# Altium footprint library AMA4B_adapter_board.PcbLib: 84 footprints (part 3 of 6)
Each footprint in its own frame and in the unit in brackets; x right, y up, seen from the top. Pads: shape width x height; smd on the part's side, far side on the other; paste and mask are expansions set on the pad; w line width, h text height; cw(c..) or ccw(c..) is an arc to the next point about the centre after c.
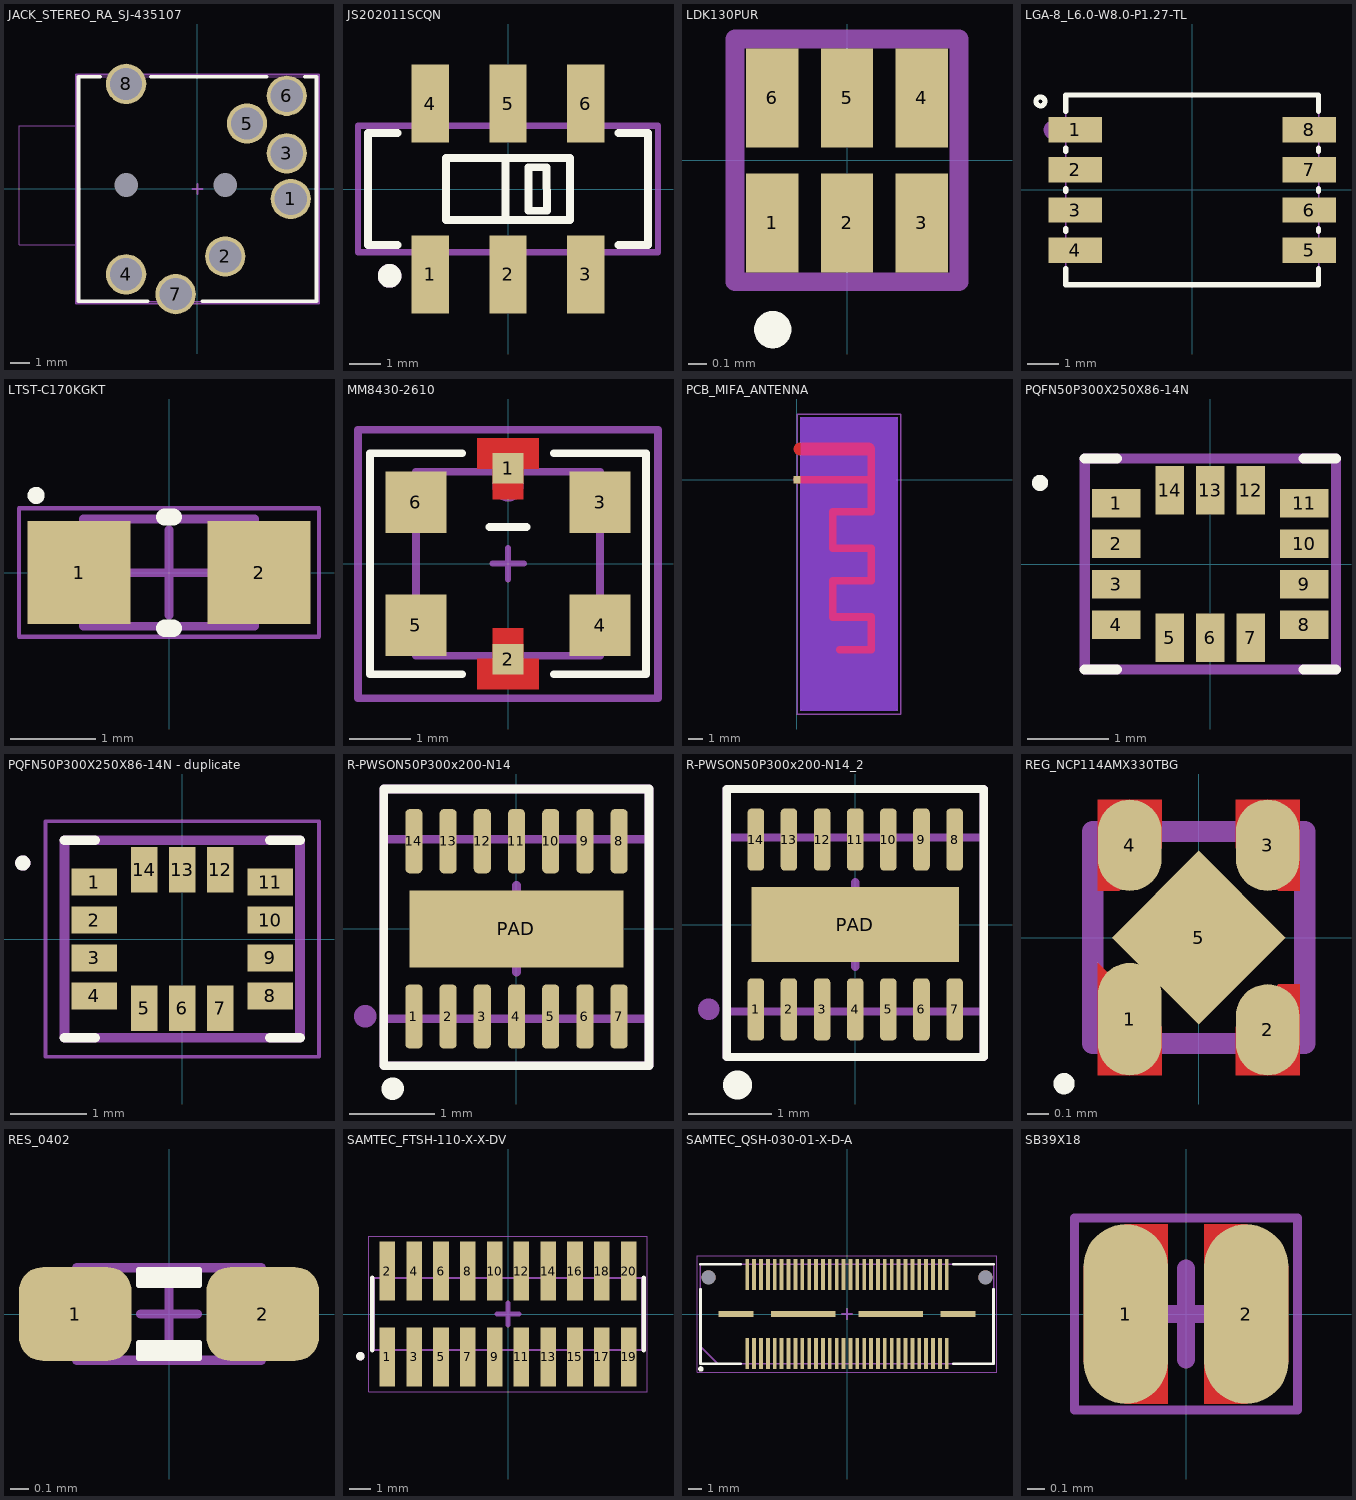
[diagram p2: the footprints below, top view; thin cyan lines are the x and y axes]

## JACK_STEREO_RA_SJ-435107 [mil] "JACK_STEREO_RA_SJ-435107"
pads (10):
  round 80 hole 64: 1(185.1,-19.75) 2(55.1,-133.85) 3(177.2,70.85) 4(-141.7,-169.35) 5(98.4,129.85) 6(177.2,185.05) 7(-43.3,-208.65) 8(-141.7,208.65)
  round 10 hole 47 unplated: ""(-141.7,7.85) ""(55.1,7.85)
Top Overlay:
  lines w1: -236.2,-222.45 -236.2,222.45 ; 236.2,-222.45 236.2,222.45
  lines w7.1: -192.9,222.45 -236.2,222.45 -236.2,-222.45 -98.4,-222.45 ; -92.5,222.45 137.8,222.45 ; 9.9,-222.45 236.2,-222.45 236.2,222.45 212.6,222.45
Board Shape:
  lines w1: -236.2,-110.25 -354.3,-110.25 -354.3,125.95 -236.2,125.95 ; -236.2,-222.45 -236.2,222.45 236.2,222.45 236.2,-222.45 -236.2,-222.45
  text ".Designator" at -14.81,-81.28 h40
Top Courtyard:
  lines w4: -241.2,-227.45 -241.2,227.45 241.2,227.45 241.2,-227.45 -241.2,-227.45
Top Component Center:
  lines w4: -10,0 10,0 ; 0,-10 0,10
3D body: height 250, standoff 0, extent -236.2,-222.45 236.2,222.45
3D body: height 248, standoff 12, extent -354.3,-110.15 -236.3,125.85

## JS202011SCQN [mm]
pads (6):
  rect 1.2x2.5 smd: 1(-2.5,-2.75) 2(0,-2.75) 3(2.5,-2.75) 4(-2.5,2.75) 5(0,2.75) 6(2.5,2.75)
Top Overlay:
  circle w0.508: c-3.81,-2.794 r0.127
  lines w0.254: -3.556,-1.8 -4.5,-1.8 -4.5,1.8 -3.556,1.8 ; -0.08,-1 -0.08,1 ; 3.556,-1.8 4.5,-1.8 4.5,1.8 3.556,1.8 ; -2,-1 -2,1 2,1 2,-1 -2,-1 ; 0.66,-0.7 0.66,0.7 1.24,0.7 1.26,-0.7 0.66,-0.7
Board Shape:
  circle w0.508: c-3.81,-2.794 r0.127
  lines w0.203: -0.08,-1 -0.08,1 ; -4.826,-2.032 -4.826,2.032 4.826,2.032 4.826,-2.032 -4.826,-2.032 ; -2,-1 2,-1 2,1 -2,1 -2,-1 ; 0.66,-0.7 0.66,0.7 1.24,0.7 1.26,-0.7 0.66,-0.7
  text ".Designator" at -3.008,-3.409 h1.52
3D body "JS.stp": height 3.6, standoff 0, extent -4.6,-3.5 4.6,3.5

## LDK130PUR [mm]
pads (6):
  rect 0.28x0.53 smd: 1(-0.4,-0.335) 2(0,-0.335) 3(0.4,-0.335) 4(0.4,0.335) 5(0,0.335) 6(-0.4,0.335)
Top Overlay:
  lines w0.1: -0.397,-0.957 ccw(c-0.397,-0.907) -0.397,-0.857 ccw(c-0.397,-0.907) -0.397,-0.957
Top 3D Body:
  lines w0.1: -0.6,-0.65 -0.6,0.65 0.6,0.65 0.6,-0.65 -0.6,-0.65
3D body "LDK130PU-R.stp": height 0.51, standoff 0, extent -0.648,-0.597 0.648,0.597

## LGA-8_L6.0-W8.0-P1.27-TL [mm]
pads (8):
  rect 1.7x0.8 smd: 1(-3.7,1.905) 2(-3.7,0.635) 3(-3.7,-0.635) 4(-3.7,-1.905) 5(3.7,-1.905) 6(3.7,-0.635) 7(3.7,0.635) 8(3.7,1.905)
Top Overlay:
  circle w0.16: c-4.8,2.8 r0.141
  lines w0.16: -4,-2.489 -4,-3 4,-3 4,-2.489 ; -4,-1.321 -4,-1.219 ; -4,-0.051 -4,0.051 ; -4,1.219 -4,1.321 ; -4,2.489 -4,3 4,3 4,2.489 ; 4,-1.321 4,-1.219 ; 4,-0.051 4,0.051 ; 4,1.219 4,1.321
Mechanical 6:
  circle w0.3: c-4.4,1.9 r0.15
Top Courtyard:
  region: -4,2.28 -3.25,2.28 -3.25,1.53 -4,1.53
  region: -4,1.01 -3.25,1.01 -3.25,0.26 -4,0.26
  region: -4,-0.26 -3.25,-0.26 -3.25,-1.01 -4,-1.01
  region: -4,-1.53 -3.25,-1.53 -3.25,-2.28 -4,-2.28
  region: 3.25,2.28 4,2.28 4,1.53 3.25,1.53
  region: 3.25,1.01 4,1.01 4,0.26 3.25,0.26
  region: 3.25,-0.26 4,-0.26 4,-1.01 3.25,-1.01
  region: 3.25,-1.53 4,-1.53 4,-2.28 3.25,-2.28
  region: -3.94,3 -3.941,3.025 -3.976,3.059 -4.025,3.059 -4.06,3.025 -4.06,3 -4.06,2.976 -4.025,2.941 -3.976,2.941 -3.941,2.976 -3.94,3
  lines w0.051: -4,-3 -4,3 4,3 4,-3 -4,-3
3D body "W25N01GVZEIG_TR.stp": height 0.8, standoff 0, extent -4.05,-3 4.05,3

## LTST-C170KGKT [mm] "SMD, 2-Leads, Body 2.00x1.25mm"
height 1.1
pads (2):
  rect 1.2x1.2 smd: 1(-1.05,0) 2(1.05,0)
Top Overlay:
  circle w0.1: c-1.55,0.9 r0.05
  lines w0.2: -0.05,-0.65 0.05,-0.65 ; -0.05,0.65 0.05,0.65
Board Shape:
  rectangle: -1,-0.625 -0.731,0.625
  lines w0.1: -1,-0.625 1,-0.625 1,0.625 -1,0.625 -1,-0.625
  text ".Designator" at 2.289,0.23 h1.02
Top Courtyard:
  lines w0.05: -1.75,-0.75 -1.75,0.75 1.75,0.75 1.75,-0.75 -1.75,-0.75
Top Component Center:
  lines w0.1: -0.5,0 0.5,0 ; 0,-0.5 0,0.5
3D body: height 0.5, standoff 0, extent -1,-0.625 1,0.625
3D body: height 1.1, standoff 0.5, extent -0.7,-0.625 0.7,0.625

## MM8430-2610 [mm] "MM8430-2610"
pads (6):
  rect 0.498x0.498 smd paste+0 mask+0.102: 1(0,1.557)
  rect 0.5x0.5 smd mask+0.102: 2(0,-1.557)
  rect 1.001x1.001 smd mask+0.05: 3(1.501,1.001) 4(1.501,-1.001) 5(-1.501,-1.001) 6(-1.501,1.001)
Top Layer:
  region: -0.249,1.049 -0.249,1.549 -0.5,1.549 -0.5,2.05 0.5,2.05 0.5,1.549 0.249,1.549 0.249,1.049
  region: 0.249,-1.049 0.249,-1.549 0.5,-1.549 0.5,-2.05 -0.5,-2.05 -0.5,-1.549 -0.249,-1.549 -0.249,-1.049
  region: 0.249,-1.049 0.249,-1.549 0.5,-1.549 0.5,-2.05 -0.5,-2.05 -0.5,-1.549 -0.249,-1.549 -0.249,-1.049
Top Overlay:
  lines w0.127: -0.749,-1.801 -2.25,-1.801 -2.25,1.801 -0.749,1.801 ; -0.3,0.6 0.3,0.6 ; 0.749,-1.801 2.25,-1.801 2.25,1.801 0.749,1.801
Top Paste:
  region: 0.249,-1.049 0.249,-1.549 0.5,-1.549 0.5,-2.05 -0.5,-2.05 -0.5,-1.549 -0.249,-1.549 -0.249,-1.049
  region: 0.249,-1.049 0.249,-1.549 0.5,-1.549 0.5,-2.05 -0.5,-2.05 -0.5,-1.549 -0.249,-1.549 -0.249,-1.049
  region: -0.249,1.049 -0.249,1.549 -0.5,1.549 -0.5,2.05 0.5,2.05 0.5,1.549 0.249,1.549 0.249,1.049
  region: -0.249,1.049 -0.249,1.549 -0.5,1.549 -0.5,2.05 0.5,2.05 0.5,1.549 0.249,1.549 0.249,1.049
Top Solder:
  region: -0.3,0.998 -0.3,1.499 -0.551,1.499 -0.551,2.098 0.551,2.098 0.551,1.499 0.3,1.499 0.3,0.998
  region: 0.3,-0.998 0.3,-1.499 0.551,-1.499 0.551,-2.098 -0.551,-2.098 -0.551,-1.499 -0.3,-1.499 -0.3,-0.998
Board Shape:
  circle w0.254: c0,1.27 r0.127
  lines w0.127: -1.501,-1.501 1.501,-1.501 1.501,1.501 -1.501,1.501 -1.501,-1.501
  text ".Designator" at -0.165,2.366 h1.02
Top Courtyard:
  lines w0.127: -2.446,-2.194 2.446,-2.194 2.446,2.186 -2.446,2.186 -2.446,-2.194
Top Component Center:
  lines w0.102: -0.252,0.004 0.256,0.004 ; 0,-0.254 0,0.254
3D body "User Library-MM8430-2610.STEP": height 1.75, standoff 0, extent -1.5,-1.496 1.5,1.504

## PCB_MIFA_ANTENNA [mil] "PCB_MIFA_ANTENNA"
pads (1):
  rect 19x20.7 smd paste+0 mask+4: 1(0,0)
Top Layer:
  lines w20.7: 0.9,0.1 200.9,0.1 ; 115.9,-458.9 200.9,-458.9 200.9,-370.9 96.9,-370.9 96.9,-272.9 200.9,-272.9 200.9,-184.9 96.9,-184.9 96.9,-86.9 200.9,-86.9 200.9,0.1 ; 200.9,83.1 200.9,0.1
  lines w36: 8.9,83.1 192.9,83.1
Top Layer keep-out:
  region: 182.89,59.13 182.89,15.91 10.9,15.91 10.9,59.13
  region: 43.9,124.91 43.9,108.04 11,108.04 11,124.91 11,167.4 268.9,167.4 268.9,-622.6 11,-622.6 11,-22.13 168.9,-22.13 168.9,-56.09 75.99,-56.09 75.99,-211.29 174.01,-211.29 174.01,-248.27 75.99,-248.27 75.99,-397.45 168.9,-397.45 168.9,-432.28 75.99,-432.28 75.99,-485.16 231.19,-485.16 231.19,-340.27 121.99,-340.27 121.99,-295.13 231.19,-295.13 231.19,-160.13 121.99,-160.13 121.99,-113.27 231.19,-113.27 231.19,124.91
Mid-Layer 1 keep-out:
  region: 11,-622.6 271,-622.6 271,167.4 11,167.4
Bottom Layer keep-out:
  region: 11,-622.6 271,-622.6 271,167.4 11,167.4
Top Overlay:
  text ".Designator" at -86.1,168.1 h40
Board Shape:
  lines w4: 11,-622.6 271,-622.6 271,167.4 11,167.4 11,-622.6
  text ".Designator" at 45,120 h40
  text "PCB Antenna" at 160.44,-100 h40
  text "No Assembly Req'd" at 102.51,-45 h40
Top Courtyard:
  lines w4: 1,-632.6 281,-632.6 281,177.4 1,177.4 1,-632.6
Top Component Center:
  lines w4: -10,0 10,0 ; 0,-10 0,10

## PQFN50P300X250X86-14N [mm]
pads (14):
  rect 0.6x0.35 smd: 1(-1.16,0.75) 2(-1.16,0.25) 3(-1.16,-0.25) 4(-1.16,-0.75) 8(1.16,-0.75) 9(1.16,-0.25) 10(1.16,0.25) 11(1.16,0.75)
  rect 0.35x0.6 smd: 5(-0.5,-0.91) 6(0,-0.91) 7(0.5,-0.91) 12(0.5,0.91) 13(0,0.91) 14(-0.5,0.91)
Top Overlay:
  circle w0.1: c-2.1,1 r0.05
  lines w0.127: -1.55,-1.3 -1.15,-1.3 ; -1.55,1.3 -1.15,1.3 ; 1.15,-1.3 1.55,-1.3 ; 1.15,1.3 1.55,1.3
Top Assembly:
  lines w0.127: -1.55,-1.3 1.55,-1.3 1.55,1.3 -1.55,1.3 -1.55,-1.3
  text ".Designator" at -1.126,-0.113 h0.5
3D body "step_temp.STEP": height 0.86, standoff 0, extent -1.5,-1.25 1.5,1.25

## PQFN50P300X250X86-14N - duplicate [mm]
pads (14):
  rect 0.6x0.35 smd: 1(-1.16,0.75) 2(-1.16,0.25) 3(-1.16,-0.25) 4(-1.16,-0.75) 8(1.16,-0.75) 9(1.16,-0.25) 10(1.16,0.25) 11(1.16,0.75)
  rect 0.35x0.6 smd: 5(-0.5,-0.91) 6(0,-0.91) 7(0.5,-0.91) 12(0.5,0.91) 13(0,0.91) 14(-0.5,0.91)
Top Overlay:
  circle w0.1: c-2.1,1 r0.05
  lines w0.127: -1.55,-1.3 -1.15,-1.3 ; -1.55,1.3 -1.15,1.3 ; 1.15,-1.3 1.55,-1.3 ; 1.15,1.3 1.55,1.3
Top 3D Body:
  circle w0.1: c-2.1,1 r0.05
  lines w0.127: -1.55,-1.3 1.55,-1.3 1.55,1.3 -1.55,1.3 -1.55,-1.3
Top Courtyard:
  lines w0.05: -1.8,-1.55 -1.8,1.55 1.8,1.55 1.8,-1.55 -1.8,-1.55

## R-PWSON50P300x200-N14 [mm] "Texas Instruments DPU Package"
pads (15):
  rrect50% 0.2x0.75 smd mask+0.05: 1(-1.2,-1.025) 2(-0.8,-1.025) 3(-0.4,-1.025) 4(0,-1.025) 5(0.4,-1.025) 6(0.8,-1.025) 7(1.2,-1.025) 8(1.2,1.025) 9(0.8,1.025) 10(0.4,1.025) 11(0,1.025) 12(-0.4,1.025) 13(-0.8,1.025) 14(-1.2,1.025)
  rect 2.5x0.9 smd paste-1 mask+0.05: PAD(0,0)
Top Overlay:
  circle w0.254: c-1.449,-1.869 r0.004
  lines w0.1: -1.55,-1.6 1.55,-1.6 1.55,1.636 -1.55,1.636 -1.55,-1.6
Top Paste:
  rectangle: 0.125,-0.375 1.125,0.375
  rectangle: -1.125,-0.375 -0.125,0.375
Board Shape:
  circle w0.254: c-1.77,-1.023 r0.004
  lines w0.1: -1.55,-1.05 1.55,-1.05 1.55,1.05 -1.55,1.05 -1.55,-1.05
  text ".Designator" at 3.379,0.463 h1.52
Top Courtyard:
  lines w0.1: -1.55,-1.6 -1.55,1.636 1.55,1.636 1.55,-1.6 -1.55,-1.6
Top Component Center:
  lines w0.102: -0.508,0 0.508,0 ; 0,-0.508 0,0.508
3D body: height 0.8, standoff 0, extent -1.55,-1.05 1.55,1.05

## R-PWSON50P300x200-N14_2 [mm]
pads (15):
  rrect50% 0.2x0.75 smd mask+0.05: 1(-1.2,-1.025) 2(-0.8,-1.025) 3(-0.4,-1.025) 4(0,-1.025) 5(0.4,-1.025) 6(0.8,-1.025) 7(1.2,-1.025) 8(1.2,1.025) 9(0.8,1.025) 10(0.4,1.025) 11(0,1.025) 12(-0.4,1.025) 13(-0.8,1.025) 14(-1.2,1.025)
  rect 2.5x0.9 smd paste-1 mask+0.05: PAD(0,0)
Top Overlay:
  circle w0.254: c-1.421,-1.938 r0.048
  lines w0.1: -1.55,-1.6 -1.55,1.636 1.55,1.636 1.55,-1.6 -1.55,-1.6
Top Paste:
  rectangle: -1.125,-0.375 -0.125,0.375
  rectangle: 0.125,-0.375 1.125,0.375
Board Shape:
  circle w0.254: c-1.77,-1.023 r0.004
  lines w0.1: -1.55,-1.05 -1.55,1.05 1.55,1.05 1.55,-1.05 -1.55,-1.05
  text ".Designator" at 3.459,0.345 h1.52
Top Courtyard:
  lines w0.1: -1.55,-1.6 1.55,-1.6 1.55,1.636 -1.55,1.636 -1.55,-1.6
Top Component Center:
  lines w0.102: -0.508,0 0.508,0 ; 0,-0.508 0,0.508
3D body: height 0.8, standoff 0, extent -1.55,-1.05 1.55,1.05

## REG_NCP114AMX330TBG [mm]
pads (5):
  shape10 0.3x0.53 smd: 1(-0.325,-0.385)
  shape10 0.3x0.43 smd: 2(0.325,-0.435) 3(0.325,0.435) 4(-0.325,0.435)
  rect 0.58x0.58 smd rot 45 mask+0: 5(0,0)
Top Layer:
  region: 0.475,-0.65 0.175,-0.65 0.175,-0.42 0.375,-0.22 0.475,-0.22
  region: -0.175,-0.42 -0.175,-0.65 -0.475,-0.65 -0.475,-0.12
  region: -0.175,0.42 -0.375,0.22 -0.475,0.22 -0.475,0.65 -0.175,0.65
  region: 0.475,0.22 0.375,0.22 0.175,0.42 0.175,0.65 0.475,0.65
Top Overlay:
  circle w0.05: c-0.635,-0.689 r0.025
Top Paste:
  region: -0.175,-0.42 -0.175,-0.65 -0.475,-0.65 -0.475,-0.12
  region: 0.475,-0.65 0.175,-0.65 0.175,-0.42 0.375,-0.22 0.475,-0.22
  region: 0.475,0.22 0.375,0.22 0.175,0.42 0.175,0.65 0.475,0.65
  region: -0.175,0.42 -0.375,0.22 -0.475,0.22 -0.475,0.65 -0.175,0.65
Top Solder:
  region: -0.125,-0.4 -0.125,-0.7 -0.525,-0.7 -0.525,-0.05 -0.475,-0.05
  region: 0.525,0.175 0.35,0.175 0.125,0.4 0.125,0.7 0.525,0.7
  region: 0.525,-0.7 0.125,-0.7 0.125,-0.4 0.35,-0.175 0.525,-0.175
  region: -0.125,0.4 -0.35,0.175 -0.525,0.175 -0.525,0.7 -0.125,0.7
  region: 0.35,-0.351 -0.351,-0.351 -0.351,0.35 0.35,0.35
Top Assembly:
  lines w0.1: -0.5,-0.5 -0.5,0.5 0.5,0.5 0.5,-0.5 -0.5,-0.5
  text ".Designator" at -0.674,-0.068 h0.3
3D body "NCP114AMX330TBG.STEP": height 0.58, standoff -0.03, extent -0.5,-0.5 0.5,0.5

## RES_0402 [mil]
height 13.78
pads (2):
  rrect50% 24x20 smd: 1(-20,0) 2(20,0)
Top Overlay:
  region: -6.5,9.5 6.5,9.5 6.5,6 -6.5,6
  region: 6.5,-9.5 -6.5,-9.5 -6.5,-6 6.5,-6
  lines w1: -6.5,-9.5 -6.5,-6 6.5,-6 6.5,-9.5 -6.5,-9.5 ; -6.5,6 6.5,6 6.5,9.5 -6.5,9.5 -6.5,6
Board Shape:
  lines w2: -19.69,-9.84 -19.69,9.84 19.68,9.84 19.68,-9.84 -19.69,-9.84
  text ".Designator" at -44.34,-4.45 h19.68
Top Component Center:
  lines w2: -6,0 6,0 ; 0,-6 0,6
3D body "RESC1005X03L.step": height 13.78, standoff 0, extent -19.68,-9.84 19.69,9.85

## SAMTEC_FTSH-110-X-X-DV [mm]
pads (20):
  rect 0.74x2.79 smd: 1(-5.715,-2.035) 2(-5.715,2.035) 3(-4.445,-2.035) 4(-4.445,2.035) 5(-3.175,-2.035) 6(-3.175,2.035) 7(-1.905,-2.035) 8(-1.905,2.035) 9(-0.635,-2.035) 10(-0.635,2.035) 11(0.635,-2.035) 12(0.635,2.035) 13(1.905,-2.035) 14(1.905,2.035) 15(3.175,-2.035) 16(3.175,2.035) 17(4.445,-2.035) 18(4.445,2.035) 19(5.715,-2.035) 20(5.715,2.035)
Top Overlay:
  circle w0.2: c-7,-2 r0.1
  lines w0.2: -6.435,-1.715 -6.435,1.715 ; 6.435,-1.715 6.435,1.715
Board Shape:
  circle w0.2: c-7,-2 r0.1
  lines w0.1: -6.35,-1.715 6.35,-1.715 6.35,1.715 -6.35,1.715 -6.35,-1.715
  text ".Designator" at -3.434,-0.345 h1.52
Top Courtyard:
  lines w0.05: -6.6,-3.68 6.6,-3.68 6.6,3.68 -6.6,3.68 -6.6,-3.68
Top Component Center:
  lines w0.254: -0.508,0 0.508,0 ; 0,-0.508 0,0.508
3D body "FTSH-110-01-L-DV-K-P-TR.stp": height 6.58, standoff -0.41, extent -6.35,-4.445 6.35,2.921

## SAMTEC_QSH-030-01-X-D-A [mm]
pads (66):
  rect 0.279x2.27 smd mask+0.05: 01(-7.25,-2.865) 02(-7.25,2.865) 03(-6.75,-2.865) 04(-6.75,2.865) 05(-6.25,-2.865) 06(-6.25,2.865) 07(-5.75,-2.865) 08(-5.75,2.865) 09(-5.25,-2.865) 10(-5.25,2.865) 11(-4.75,-2.865) 12(-4.75,2.865) 13(-4.25,-2.865) 14(-4.25,2.865) 15(-3.75,-2.865) 16(-3.75,2.865) 17(-3.25,-2.865) 18(-3.25,2.865) 19(-2.75,-2.865) 20(-2.75,2.865) 21(-2.25,-2.865) 22(-2.25,2.865) 23(-1.75,-2.865) 24(-1.75,2.865) 25(-1.25,-2.865) 26(-1.25,2.865) 27(-0.75,-2.865) 28(-0.75,2.865) 29(-0.25,-2.865) 30(-0.25,2.865) 31(0.25,-2.865) 32(0.25,2.865) 33(0.75,-2.865) 34(0.75,2.865) 35(1.25,-2.865) 36(1.25,2.865) 37(1.75,-2.865) 38(1.75,2.865) 39(2.25,-2.865) 40(2.25,2.865) 41(2.75,-2.865) 42(2.75,2.865) 43(3.25,-2.865) 44(3.25,2.865) 45(3.75,-2.865) 46(3.75,2.865) 47(4.25,-2.865) 48(4.25,2.865) 49(4.75,-2.865) 50(4.75,2.865) 51(5.25,-2.865) 52(5.25,2.865) 53(5.75,-2.865) 54(5.75,2.865) 55(6.25,-2.865) 56(6.25,2.865) 57(6.75,-2.865) 58(6.75,2.865) 59(7.25,-2.865) 60(7.25,2.865)
  rect 2.54x0.43 smd mask+0.05: S1(-8.065,0) S4(8.065,0)
  rect 4.7x0.43 smd mask+0.05: S2(-3.175,0) S3(3.175,0)
  round 1.02 hole 1.02 unplated: ""(-10.065,2.67) ""(10.065,2.67)
Top Overlay:
  circle w0.2: c-10.621,-3.997 r0.1
  lines w0.2: -10.655,1.8 -10.655,-3.62 -7.75,-3.62 ; -10.655,3.62 -7.75,3.62 ; 7.75,-3.62 10.655,-3.62 10.655,1.8 ; 7.75,3.62 10.655,3.62
Board Shape:
  lines w0.1: -10.655,-3.62 -10.655,3.62 10.655,3.62 10.655,-3.62 -10.655,-3.62
  lines w0.127: -10.667,-2.354 -9.367,-3.653
  text ".Designator" at 0.218,-3.485 h1.52
Top Courtyard:
  lines w0.05: -10.905,-4.25 10.905,-4.25 10.905,4.25 -10.905,4.25 -10.905,-4.25
Top Component Center:
  lines w0.127: -0.381,0 0.381,0 ; 0,-0.381 0,0.381
3D body "QSH-030-01-L-D-A--3DModel-STEP-56544.STEP": height 3.05, standoff -0.95, extent -10.635,-3.747 10.635,3.747

## SB39X18 [mil] "SB39X18"
pads (2):
  shape10 18.5x39.4 smd: 1(-13.25,0) 2(13.25,0)
Top Layer:
  region: -22.5,-10.4 -22.5,10.4 -13.3,19.7 -4,19.7 -4,-19.7 -13.3,-19.7
  region: 22.5,10.4 22.5,-10.4 13.3,-19.7 4,-19.7 4,19.7 13.3,19.7
  region: 22.5,10.4 22.5,-10.4 13.3,-19.7 4,-19.7 4,19.7 13.3,19.7
  region: -22.5,-10.4 -22.5,10.4 -13.3,19.7 -4,19.7 -4,-19.7 -13.3,-19.7
Top Solder:
  region: -24.5,11 -24.5,-11 -14.4,-21.1 0,-21.1 0,21.1 -14.4,21.1
  region: -24.5,11 -24.5,-11 -14.4,-21.1 0,-21.1 0,21.1 -14.4,21.1
  region: 24.5,-11 24.5,11 14.4,21.1 0,21.1 0,-21.1 14.4,-21.1
  region: 24.5,-11 24.5,11 14.4,21.1 0,21.1 0,-21.1 14.4,-21.1
Board Shape:
  lines w2: -24.5,-21.1 -24.5,21.1 24.5,21.1 24.5,-21.1 -24.5,-21.1
  text "No Assembly Req'd" at -24.5,-21.1 h8
  text "Solderbridge" at -20,11.5 h8
Top Component Center:
  lines w4: -10,0 10,0 ; 0,-10 0,10